# Altium footprint library Intelliclone.PcbLib: 372 footprints (part 20 of 24)
Each footprint in its own frame and in the unit in brackets; x right, y up, seen from the top. Pads: shape width x height; smd on the part's side, far side on the other; paste and mask are expansions set on the pad; w line width, h text height; cw(c..) or ccw(c..) is an arc to the next point about the centre after c.
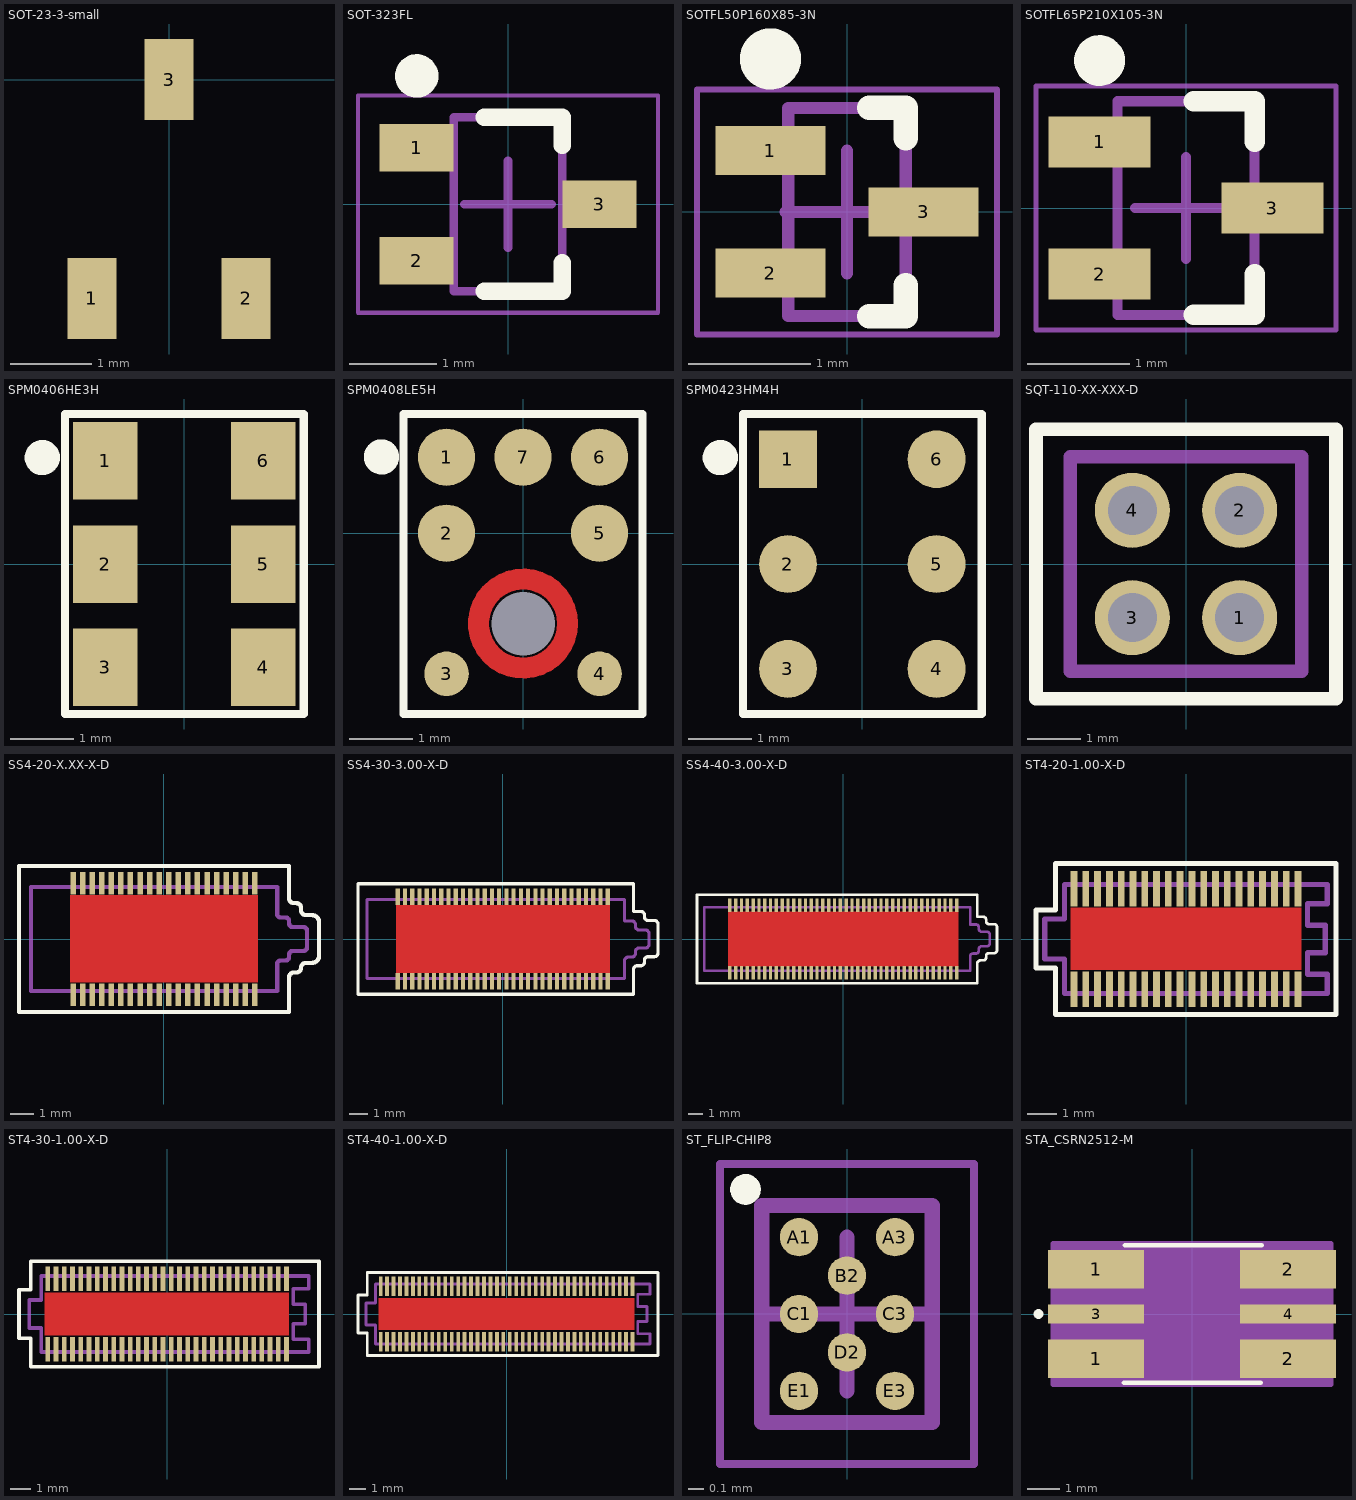
[diagram p19: the footprints below, top view; thin cyan lines are the x and y axes]

## SOT-23-3-small [mm]
pads (3):
  rect 0.6x1 smd: 1(-0.95,-2.7) 2(0.95,-2.7) 3(0,0)
3D body "User Library-N-MOS_BSS123_SOT23.STEP": height 1.01, standoff 0.01, extent -1.45,-2.489 1.45,-0.189

## SOT-323FL [mm] "SOT23, 3-Leads, Body 2.00x2.10mm, Pitch 0.65mm, IPC Medium Density"
height 1
pads (3):
  rect 0.85x0.55 smd: 1(-1.05,0.65) 2(-1.05,-0.65) 3(1.05,0)
Top Overlay:
  circle w0.25: c-1.05,1.475 r0.125
  lines w0.2: -0.275,-1 0.625,-1 0.625,-0.675 ; -0.275,1 0.625,1 0.625,0.675
Mechanical 13:
  lines w0.1: -0.625,-1 0.625,-1 0.625,1 -0.625,1 -0.625,-1
Mechanical 15:
  lines w0.05: -1.725,-1.25 1.725,-1.25 1.725,1.25 -1.725,1.25 -1.725,-1.25
  lines w0.1: -0.5,0 0.5,0 ; 0,-0.5 0,0.5
3D body "SOT65P210X100-3N.step": height 1, standoff 0.01, extent -1.093,-1 1.093,1

## SOTFL50P160X85-3N [mm] "SOTFL, 3-Leads, Body 1.60x1.60mm, Pitch 0.50mm, IPC Medium Density"
height 0.85
pads (3):
  rect 0.9x0.4 smd: 1(-0.625,0.5) 2(-0.625,-0.5) 3(0.625,0)
Top Overlay:
  circle w0.25: c-0.625,1.25 r0.125
  lines w0.2: 0.18,-0.85 0.48,-0.85 0.48,-0.6 ; 0.18,0.85 0.48,0.85 0.48,0.6
Mechanical 13:
  lines w0.1: -0.48,-0.85 0.48,-0.85 0.48,0.85 -0.48,0.85 -0.48,-0.85
Mechanical 15:
  lines w0.05: -1.225,-1 1.225,-1 1.225,1 -1.225,1 -1.225,-1
  lines w0.1: -0.5,0 0.5,0 ; 0,-0.5 0,0.5
3D body "SOTFL50P160X85-3N.step": height 0.85, standoff 0, extent -0.8,-0.848 0.8,0.848

## SOTFL65P210X105-3N [mm] "SOTFL, 3-Leads, Body 2.00x2.10mm, Pitch 0.65mm, IPC Medium Density"
height 1.05
pads (3):
  rect 1x0.5 smd: 1(-0.85,0.65) 2(-0.85,-0.65) 3(0.85,0)
Top Overlay:
  circle w0.25: c-0.85,1.45 r0.125
  lines w0.2: 0.075,-1.05 0.675,-1.05 0.675,-0.65 ; 0.075,1.05 0.675,1.05 0.675,0.65
Mechanical 13:
  lines w0.1: -0.675,-1.05 0.675,-1.05 0.675,1.05 -0.675,1.05 -0.675,-1.05
Mechanical 15:
  lines w0.05: -1.475,-1.2 1.475,-1.2 1.475,1.2 -1.475,1.2 -1.475,-1.2
  lines w0.1: -0.5,0 0.5,0 ; 0,-0.5 0,0.5
3D body "SOTFL65P210X105-3N.step": height 1.05, standoff 0, extent -1.05,-1.048 1.05,1.048

## SPM0406HE3H [mil]
pads (6):
  rect 40x47.99 smd paste-5.91: 1(-49,64.02) 2(-49,0) 3(-49,-64.02) 4(49,-64.02) 5(49,0) 6(49,64.02)
Top Overlay:
  circle w11.81: c-88,66 r5
  lines w5: -74.02,92.91 -74.02,-92.91 74.02,-92.91 74.02,92.91 ; -74,93 74.02,93
3D body: height 49.21, standoff 0, extent -74,-93 74,93

## SPM0408LE5H [mm]
pads (8):
  round 0.9 smd: 1(-1.204,1.194) 2(-1.204,0) 5(1.204,0) 6(1.204,1.194) 7(0,1.194)
  round 0.7 smd: 3(-1.204,-2.212) 4(1.204,-2.212)
  round 0 hole 1 unplated: 8(0,-1.422)
Top Layer:
  circle w0.33: c0,-1.422 r0.7
Top Overlay:
  circle w0.3: c-2.227,1.2 r0.127
  lines w0.127: -1.88,-2.845 -1.88,1.875 1.88,1.875 1.88,-2.845 -1.88,-2.845
3D body: height 1.25, standoff 0, extent -1.88,-2.824 1.88,1.9

## SPM0423HM4H [mm]
pads (6):
  rect 0.91x0.91 smd: 1(-1.17,1.65)
  round 0.91 smd: 2(-1.17,0) 3(-1.17,-1.65) 4(1.17,-1.65) 5(1.17,0) 6(1.17,1.65)
Top Overlay:
  circle w0.3: c-2.235,1.676 r0.127
  lines w0.127: -1.88,2.36 -1.88,-2.36 1.88,-2.36 1.88,2.36 ; -1.88,2.362 1.88,2.362
3D body: height 1.25, standoff 0, extent -1.88,-2.362 1.88,2.362

## SQT-110-XX-XXX-D [mil]
pads (4):
  round 55 hole 36 mask+3: 1(39.37,-39.37) 2(39.37,39.37) 3(-39.37,-39.37) 4(-39.37,39.37)
Top Overlay:
  lines w10: -110,-98.74 110,-98.74 110,98.74 -110,98.74 -110,-98.74
Mechanical 1:
  lines w10: -85,-78.74 85,-78.74 85,78.74 -85,78.74 -85,-78.74
  text "J1" at -19.57,-20 h30
3D body "SQT-102-01-F-D.stp": height 250, standoff -90, extent -84.58,-78.74 84.6,78.76

## SS4-20-X.XX-X-D [mm]
pads (40):
  rect 0.23x0.93 smd paste-0.02 mask+0.05: 1(3.8,2.335) 2(3.8,-2.335) 3(3.4,2.335) 4(3.4,-2.335) 5(3,2.335) 6(3,-2.335) 7(2.6,2.335) 8(2.6,-2.335) 9(2.2,2.335) 10(2.2,-2.335) 11(1.8,2.335) 12(1.8,-2.335) 13(1.4,2.335) 14(1.4,-2.335) 15(1,2.335) 16(1,-2.335) 17(0.6,2.335) 18(0.6,-2.335) 19(0.2,2.335) 20(0.2,-2.335) 21(-0.2,2.335) 22(-0.2,-2.335) 23(-0.6,2.335) 24(-0.6,-2.335) 25(-1,2.335) 26(-1,-2.335) 27(-1.4,2.335) 28(-1.4,-2.335) 29(-1.8,2.335) 30(-1.8,-2.335) 31(-2.2,2.335) 32(-2.2,-2.335) 33(-2.6,2.335) 34(-2.6,-2.335) 35(-3,2.335) 36(-3,-2.335) 37(-3.4,2.335) 38(-3.4,-2.335) 39(-3.8,2.335) 40(-3.8,-2.335)
Top Layer:
  pour cut-out: -3.915,1.829 3.915,1.829 3.915,-1.803 -3.915,-1.803
Top Overlay:
  lines w0.178: -6.06,-3.054 -6.06,3.054 5.228,3.054 5.228,1.7 ccw(c5.428,1.7) 5.428,1.5 5.53,1.5 cw(c5.53,1.3) 5.73,1.3 5.73,1.2 ccw(c5.93,1.2) 5.93,1 6.18,1 cw(c6.18,0.7) 6.48,0.7 6.48,-0.7 cw(c6.18,-0.7) 6.18,-1 5.93,-1 ccw(c5.93,-1.2) 5.73,-1.2 cw(c5.53,-1.2) 5.53,-1.4 5.428,-1.4 ccw(c5.428,-1.6) 5.228,-1.6 5.228,-3.054 -6.06,-3.054
Mechanical 1:
  lines w0.178: -5.56,-2.175 -5.56,2.175 4.73,2.175 4.73,1.05 ccw(c4.88,1.05) 4.88,0.9 5.08,0.9 cw(c5.08,0.75) 5.23,0.75 5.23,0.65 ccw(c5.38,0.65) 5.38,0.5 5.83,0.5 cw(c5.83,0.35) 5.98,0.35 5.98,-0.35 cw(c5.83,-0.35) 5.83,-0.5 5.38,-0.5 ccw(c5.38,-0.65) 5.23,-0.65 5.23,-0.75 cw(c5.08,-0.75) 5.08,-0.9 4.88,-0.9 ccw(c4.88,-1.05) 4.73,-1.05 4.73,-2.175 -5.56,-2.175
  text "J1" at -0.497,-0.508 h0.76
3D body "SS4-20-3.00-L-D.stp": height 3.48, standoff -0.02, extent -5.56,-2.5 5.98,2.5

## SS4-30-3.00-X-D [mm]
pads (60):
  rect 0.23x0.93 smd paste-0.02 mask+0.05: 1(5.8,2.335) 2(5.8,-2.335) 3(5.4,2.335) 4(5.4,-2.335) 5(5,2.335) 6(5,-2.335) 7(4.6,2.335) 8(4.6,-2.335) 9(4.2,2.335) 10(4.2,-2.335) 11(3.8,2.335) 12(3.8,-2.335) 13(3.4,2.335) 14(3.4,-2.335) 15(3,2.335) 16(3,-2.335) 17(2.6,2.335) 18(2.6,-2.335) 19(2.2,2.335) 20(2.2,-2.335) 21(1.8,2.335) 22(1.8,-2.335) 23(1.4,2.335) 24(1.4,-2.335) 25(1,2.335) 26(1,-2.335) 27(0.6,2.335) 28(0.6,-2.335) 29(0.2,2.335) 30(0.2,-2.335) 31(-0.2,2.335) 32(-0.2,-2.335) 33(-0.6,2.335) 34(-0.6,-2.335) 35(-1,2.335) 36(-1,-2.335) 37(-1.4,2.335) 38(-1.4,-2.335) 39(-1.8,2.335) 40(-1.8,-2.335) 41(-2.2,2.335) 42(-2.2,-2.335) 43(-2.6,2.335) 44(-2.6,-2.335) 45(-3,2.335) 46(-3,-2.335) 47(-3.4,2.335) 48(-3.4,-2.335) 49(-3.8,2.335) 50(-3.8,-2.335) 51(-4.2,2.335) 52(-4.2,-2.335) 53(-4.6,2.335) 54(-4.6,-2.335) 55(-5,2.335) 56(-5,-2.335) 57(-5.4,2.335) 58(-5.4,-2.335) 59(-5.8,2.335) 60(-5.8,-2.335)
Top Layer:
  pour cut-out: -5.9,1.87 5.915,1.87 5.915,-1.87 -5.9,-1.87
Top Overlay:
  lines w0.178: -8,-3.054 -8,3.054 7.228,3.054 7.228,1.525 7.628,1.525 cw(c7.628,1.325) 7.828,1.325 7.828,1.225 ccw(c8.028,1.225) 8.028,1.025 8.378,1.025 cw(c8.378,0.825) 8.578,0.825 8.578,-0.775 cw(c8.378,-0.775) 8.378,-0.975 8.028,-0.975 ccw(c8.028,-1.175) 7.828,-1.175 7.828,-1.275 cw(c7.628,-1.275) 7.628,-1.475 7.428,-1.475 ccw(c7.428,-1.675) 7.228,-1.675 7.228,-3.054 -8,-3.054
Mechanical 1:
  lines w0.178: -7.5,-2.175 -7.5,2.175 6.73,2.175 6.73,1 7.13,1 cw(c7.13,0.8) 7.33,0.8 7.33,0.7 ccw(c7.53,0.7) 7.53,0.5 7.88,0.5 cw(c7.88,0.3) 8.08,0.3 8.08,-0.3 cw(c7.88,-0.3) 7.88,-0.5 7.53,-0.5 ccw(c7.53,-0.7) 7.33,-0.7 7.33,-0.8 cw(c7.13,-0.8) 7.13,-1 6.93,-1 ccw(c6.93,-1.2) 6.73,-1.2 6.73,-2.175 -7.5,-2.175
  text "J1" at -2.37,-0.377 h0.5
3D body "SS4-30-3.00-L-D.stp": height 3.48, standoff -0.02, extent -7.5,-2.5 8.04,2.5

## SS4-40-3.00-X-D [mm]
pads (80):
  rect 0.23x0.93 smd paste-0.02 mask+0.05: 1(7.8,2.335) 2(7.8,-2.335) 3(7.4,2.335) 4(7.4,-2.335) 5(7,2.335) 6(7,-2.335) 7(6.6,2.335) 8(6.6,-2.335) 9(6.2,2.335) 10(6.2,-2.335) 11(5.8,2.335) 12(5.8,-2.335) 13(5.4,2.335) 14(5.4,-2.335) 15(5,2.335) 16(5,-2.335) 17(4.6,2.335) 18(4.6,-2.335) 19(4.2,2.335) 20(4.2,-2.335) 21(3.8,2.335) 22(3.8,-2.335) 23(3.4,2.335) 24(3.4,-2.335) 25(3,2.335) 26(3,-2.335) 27(2.6,2.335) 28(2.6,-2.335) 29(2.2,2.335) 30(2.2,-2.335) 31(1.8,2.335) 32(1.8,-2.335) 33(1.4,2.335) 34(1.4,-2.335) 35(1,2.335) 36(1,-2.335) 37(0.6,2.335) 38(0.6,-2.335) 39(0.2,2.335) 40(0.2,-2.335) 41(-0.2,2.335) 42(-0.2,-2.335) 43(-0.6,2.335) 44(-0.6,-2.335) 45(-1,2.335) 46(-1,-2.335) 47(-1.4,2.335) 48(-1.4,-2.335) 49(-1.8,2.335) 50(-1.8,-2.335) 51(-2.2,2.335) 52(-2.2,-2.335) 53(-2.6,2.335) 54(-2.6,-2.335) 55(-3,2.335) 56(-3,-2.335) 57(-3.4,2.335) 58(-3.4,-2.335) 59(-3.8,2.335) 60(-3.8,-2.335) 61(-4.2,2.335) 62(-4.2,-2.335) 63(-4.6,2.335) 64(-4.6,-2.335) 65(-5,2.335) 66(-5,-2.335) 67(-5.4,2.335) 68(-5.4,-2.335) 69(-5.8,2.335) 70(-5.8,-2.335) 71(-6.2,2.335) 72(-6.2,-2.335) 73(-6.6,2.335) 74(-6.6,-2.335) 75(-7,2.335) 76(-7,-2.335) 77(-7.4,2.335) 78(-7.4,-2.335) 79(-7.8,2.335) 80(-7.8,-2.335)
Top Layer:
  pour cut-out: -7.915,1.87 7.915,1.87 7.915,-1.87 -7.915,-1.87
Top Overlay:
  lines w0.178: -10.06,-3.054 9.228,-3.054 9.228,-1.675 cw(c9.428,-1.675) 9.428,-1.475 9.628,-1.475 ccw(c9.628,-1.275) 9.828,-1.275 9.828,-1.175 cw(c10.028,-1.175) 10.028,-0.975 10.378,-0.975 ccw(c10.378,-0.775) 10.578,-0.775 10.578,0.825 ccw(c10.378,0.825) 10.378,1.025 10.028,1.025 cw(c10.028,1.225) 9.828,1.225 9.828,1.325 ccw(c9.628,1.325) 9.628,1.525 9.228,1.525 9.228,3.054 -10.06,3.054 -10.06,-3.054
Mechanical 1:
  lines w0.178: -9.56,-2.175 8.73,-2.175 8.73,-1.2 cw(c8.93,-1.2) 8.93,-1 9.13,-1 ccw(c9.13,-0.8) 9.33,-0.8 9.33,-0.7 cw(c9.53,-0.7) 9.53,-0.5 9.88,-0.5 ccw(c9.88,-0.3) 10.08,-0.3 10.08,0.3 ccw(c9.88,0.3) 9.88,0.5 9.53,0.5 cw(c9.53,0.7) 9.33,0.7 9.33,0.8 ccw(c9.13,0.8) 9.13,1 8.73,1 8.73,2.175 -9.56,2.175 -9.56,-2.175
  text "J1" at -0.37,-0.377 h0.5
3D body "SS4-40-3.00-L-D.stp": height 3.48, standoff -0.02, extent -9.56,-2.5 9.98,2.5

## ST4-20-1.00-X-D [mm] "Samtec ST4 Series Connector 20 pins per row"
height 3.08
pads (40):
  rect 0.23x1.2 smd paste-0.015 mask+0.05: 1(3.8,-1.71) 2(3.8,1.71) 3(3.4,-1.71) 4(3.4,1.71) 5(3,-1.71) 6(3,1.71) 7(2.6,-1.71) 8(2.6,1.71) 9(2.2,-1.71) 10(2.2,1.71) 11(1.8,-1.71) 12(1.8,1.71) 13(1.4,-1.71) 14(1.4,1.71) 15(1,-1.71) 16(1,1.71) 17(0.6,-1.71) 18(0.6,1.71) 19(0.2,-1.71) 20(0.2,1.71) 21(-0.2,-1.71) 22(-0.2,1.71) 23(-0.6,-1.71) 24(-0.6,1.71) 25(-1,-1.71) 26(-1,1.71) 27(-1.4,-1.71) 28(-1.4,1.71) 29(-1.8,-1.71) 30(-1.8,1.71) 31(-2.2,-1.71) 32(-2.2,1.71) 33(-2.6,-1.71) 34(-2.6,1.71) 35(-3,-1.71) 36(-3,1.71) 37(-3.4,-1.71) 38(-3.4,1.71) 39(-3.8,-1.71) 40(-3.8,1.71)
Top Layer:
  pour cut-out: 3.915,-1.041 -3.915,-1.041 -3.915,1.067 3.915,1.067
Top Overlay:
  lines w0.178: -5.09,-0.98 -4.425,-0.98 -4.425,-2.56 5.09,-2.56 5.09,2.56 -4.425,2.56 -4.425,0.98 -5.09,0.98 -5.09,-0.98
Mechanical 1:
  lines w0.178: -4.79,-0.68 -4.125,-0.68 -4.125,-1.85 4.79,-1.85 4.79,-1.2 4.125,-1.2 4.125,-0.47 4.725,-0.47 4.725,0.47 4.125,0.47 4.125,1.2 4.79,1.2 4.79,1.85 -4.125,1.85 -4.125,0.68 -4.79,0.68 -4.79,-0.68
  text "J1" at 0.446,0.457 h0.76
3D body "ST4-20-1.00-L-D.stp": height 2.76, standoff -0.32, extent -4.7,-1.95 4.88,2.05

## ST4-30-1.00-X-D [mm] "Samtec ST4 Series Connector 30 pins per row"
height 3.08
pads (60):
  rect 0.23x1.2 smd paste-0.015 mask+0.05: 1(5.8,-1.71) 2(5.8,1.71) 3(5.4,-1.71) 4(5.4,1.71) 5(5,-1.71) 6(5,1.71) 7(4.6,-1.71) 8(4.6,1.71) 9(4.2,-1.71) 10(4.2,1.71) 11(3.8,-1.71) 12(3.8,1.71) 13(3.4,-1.71) 14(3.4,1.71) 15(3,-1.71) 16(3,1.71) 17(2.6,-1.71) 18(2.6,1.71) 19(2.2,-1.71) 20(2.2,1.71) 21(1.8,-1.71) 22(1.8,1.71) 23(1.4,-1.71) 24(1.4,1.71) 25(1,-1.71) 26(1,1.71) 27(0.6,-1.71) 28(0.6,1.71) 29(0.2,-1.71) 30(0.2,1.71) 31(-0.2,-1.71) 32(-0.2,1.71) 33(-0.6,-1.71) 34(-0.6,1.71) 35(-1,-1.71) 36(-1,1.71) 37(-1.4,-1.71) 38(-1.4,1.71) 39(-1.8,-1.71) 40(-1.8,1.71) 41(-2.2,-1.71) 42(-2.2,1.71) 43(-2.6,-1.71) 44(-2.6,1.71) 45(-3,-1.71) 46(-3,1.71) 47(-3.4,-1.71) 48(-3.4,1.71) 49(-3.8,-1.71) 50(-3.8,1.71) 51(-4.2,-1.71) 52(-4.2,1.71) 53(-4.6,-1.71) 54(-4.6,1.71) 55(-5,-1.71) 56(-5,1.71) 57(-5.4,-1.71) 58(-5.4,1.71) 59(-5.8,-1.71) 60(-5.8,1.71)
Top Layer:
  pour cut-out: 5.915,-1.041 -5.95,-1.041 -5.95,1.041 5.915,1.041
Top Overlay:
  lines w0.178: -7.2,-1.18 -6.625,-1.18 -6.625,-2.56 7.375,-2.56 7.375,2.56 -6.625,2.56 -6.625,1.18 -7.2,1.18 -7.2,-1.18
Mechanical 1:
  lines w0.178: -6.7,-0.68 -6.125,-0.68 -6.125,-1.85 6.875,-1.85 6.875,-1.225 6.125,-1.225 6.125,-0.47 6.7,-0.47 6.7,0.47 6.125,0.47 6.125,1.225 6.875,1.225 6.875,1.85 -6.125,1.85 -6.125,0.68 -6.7,0.68 -6.7,-0.68
  text "J1" at -1.63,0.377 h0.5
3D body "ST4-30-1.00-L-D.stp": height 2.76, standoff -0.32, extent -6.705,-2 6.875,2

## ST4-40-1.00-X-D [mm] "Samtec ST4 Series Connector 40 pins per row"
height 3.08
pads (80):
  rect 0.23x1.2 smd paste-0.015 mask+0.05: 1(7.8,-1.71) 2(7.8,1.71) 3(7.4,-1.71) 4(7.4,1.71) 5(7,-1.71) 6(7,1.71) 7(6.6,-1.71) 8(6.6,1.71) 9(6.2,-1.71) 10(6.2,1.71) 11(5.8,-1.71) 12(5.8,1.71) 13(5.4,-1.71) 14(5.4,1.71) 15(5,-1.71) 16(5,1.71) 17(4.6,-1.71) 18(4.6,1.71) 19(4.2,-1.71) 20(4.2,1.71) 21(3.8,-1.71) 22(3.8,1.71) 23(3.4,-1.71) 24(3.4,1.71) 25(3,-1.71) 26(3,1.71) 27(2.6,-1.71) 28(2.6,1.71) 29(2.2,-1.71) 30(2.2,1.71) 31(1.8,-1.71) 32(1.8,1.71) 33(1.4,-1.71) 34(1.4,1.71) 35(1,-1.71) 36(1,1.71) 37(0.6,-1.71) 38(0.6,1.71) 39(0.2,-1.71) 40(0.2,1.71) 41(-0.2,-1.71) 42(-0.2,1.71) 43(-0.6,-1.71) 44(-0.6,1.71) 45(-1,-1.71) 46(-1,1.71) 47(-1.4,-1.71) 48(-1.4,1.71) 49(-1.8,-1.71) 50(-1.8,1.71) 51(-2.2,-1.71) 52(-2.2,1.71) 53(-2.6,-1.71) 54(-2.6,1.71) 55(-3,-1.71) 56(-3,1.71) 57(-3.4,-1.71) 58(-3.4,1.71) 59(-3.8,-1.71) 60(-3.8,1.71) 61(-4.2,-1.71) 62(-4.2,1.71) 63(-4.6,-1.71) 64(-4.6,1.71) 65(-5,-1.71) 66(-5,1.71) 67(-5.4,-1.71) 68(-5.4,1.71) 69(-5.8,-1.71) 70(-5.8,1.71) 71(-6.2,-1.71) 72(-6.2,1.71) 73(-6.6,-1.71) 74(-6.6,1.71) 75(-7,-1.71) 76(-7,1.71) 77(-7.4,-1.71) 78(-7.4,1.71) 79(-7.8,-1.71) 80(-7.8,1.71)
Top Layer:
  pour cut-out: 7.915,-0.965 -7.915,-0.965 -7.915,0.965 7.915,0.965
Top Overlay:
  lines w0.178: -9.2,-1.18 -8.625,-1.18 -8.625,-2.56 9.375,-2.56 9.375,2.56 -8.625,2.56 -8.625,1.18 -9.2,1.18 -9.2,-1.18
Mechanical 1:
  lines w0.178: -8.7,-0.68 -8.125,-0.68 -8.125,-1.85 8.875,-1.85 8.875,-1.225 8.125,-1.225 8.125,-0.47 8.7,-0.47 8.7,0.47 8.125,0.47 8.125,1.225 8.875,1.225 8.875,1.85 -8.125,1.85 -8.125,0.68 -8.7,0.68 -8.7,-0.68
  text "J1" at -0.305,-0.152 h0.5
3D body "ST4-40-1.00-L-D.stp": height 2.76, standoff -0.32, extent -8.705,-1.925 8.875,2.075

## ST_FLIP-CHIP8 [mm] "BGA, 8-Leads, Body 1.11x1.41mmx0.60mm, Pitch 0.31mm"
height 0.6
pads (8):
  round 0.25 smd: A1(-0.312,0.5) A3(0.312,0.5) B2(0,0.25) C1(-0.312,0) C3(0.312,0) D2(0,-0.25) E1(-0.312,-0.5) E3(0.312,-0.5)
Top Overlay:
  circle w0.1: c-0.66,0.81 r0.05
Mechanical 13:
  lines w0.1: -0.555,-0.705 -0.555,0.705 0.555,0.705 0.555,-0.705 -0.555,-0.705
Mechanical 15:
  lines w0.05: -0.825,-0.975 -0.825,0.975 0.825,0.975 0.825,-0.975 -0.825,-0.975
  lines w0.1: -0.5,0 0.5,0 ; 0,-0.5 0,0.5
3D body "BGAS8C31P3X5_111X141X60.step": height 0.6, standoff 0, extent -0.555,-0.747 0.555,0.747

## STA_CSRN2512-M [mm]
pads (6):
  rect 3x1.2 smd: 1(-3,-1.4) 1(-3,1.4) 2(3,-1.4) 2(3,1.4)
  rect 3x0.6 smd: 3(-3,0) 4(3,0)
Top Overlay:
  circle w0.152: c-4.8,0 r0.076
  lines w0.152: -2.13,-2.15 2.15,-2.15 ; -2.1,2.15 2.18,2.15
Mechanical 13:
  circle w0: c-3.023,0 r0.076
  lines w0.025: -3.277,-1.651 -3.277,1.651 ; -3.277,-1.651 -2.464,-1.651 -2.464,1.651 -3.277,1.651 ; -3.277,-1.651 3.277,-1.651 ; -3.277,-1.651 -3.277,1.651 ; -3.277,1.651 3.277,1.651 ; 3.277,-1.651 2.464,-1.651 2.464,1.651 3.277,1.651 ; 3.277,-1.651 3.277,1.651 ; 3.277,-1.651 3.277,1.651
Mechanical 15:
  region: 4.343,-2.21 -4.343,-2.21 -4.343,2.21 4.343,2.21
  lines w0.152: -4.343,-2.21 -4.343,2.21 4.343,2.21 4.343,-2.21 -4.343,-2.21
3D body "STA_CSRN2512.stp": height 0.71, standoff 0, extent -3.302,-1.651 3.252,1.651
3D body: height 0.25, standoff 0, extent 0,0 0.254,0.254